# Altium footprint library PcbLibUltimate (1).pcblib: 202 footprints (part 5 of 13)
Each footprint in its own frame and in the unit in brackets; x right, y up, seen from the top. Pads: shape width x height; smd on the part's side, far side on the other; paste and mask are expansions set on the pad; w line width, h text height; cw(c..) or ccw(c..) is an arc to the next point about the centre after c.
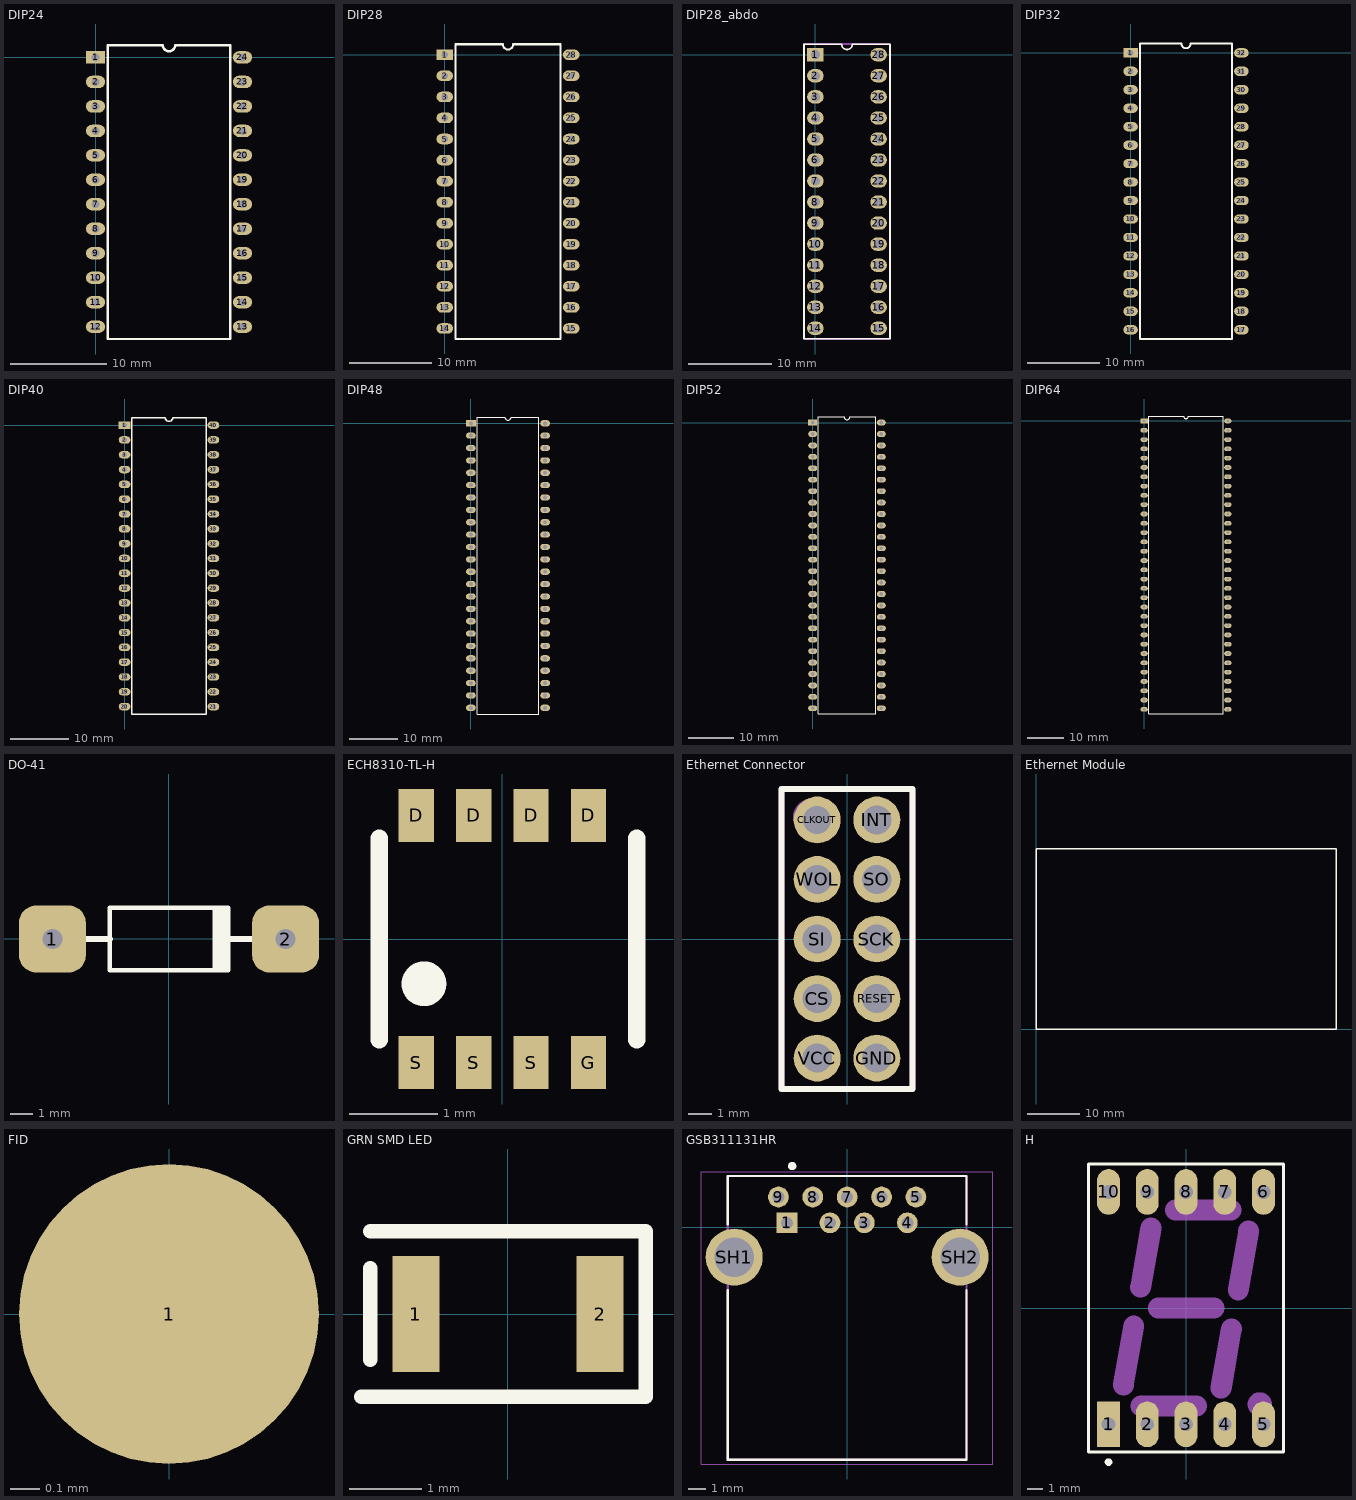
[diagram p4: the footprints below, top view; thin cyan lines are the x and y axes]

## DIP24 [mil]
pads (24):
  rect 78.74x50 hole 32: 1(0,0)
  oval 78.74x50 hole 32: 2(0,-100) 3(0,-200) 4(0,-300) 5(0,-400) 6(0,-500) 7(0,-600) 8(0,-700) 9(0,-800) 10(0,-900) 11(0,-1000) 12(0,-1100) 13(600,-1100) 14(600,-1000) 15(600,-900) 16(600,-800) 17(600,-700) 18(600,-600) 19(600,-500) 20(600,-400) 21(600,-300) 22(600,-200) 23(600,-100) 24(600,0)
Top Overlay:
  lines w10: 50,-1150 50,50 275,50 ccw(c300,50) 325,50 550,50 550,-1150 50,-1150

## DIP28 [mil]
pads (28):
  rect 78.74x50 hole 32: 1(0,0)
  oval 78.74x50 hole 32: 2(0,-100) 3(0,-200) 4(0,-300) 5(0,-400) 6(0,-500) 7(0,-600) 8(0,-700) 9(0,-800) 10(0,-900) 11(0,-1000) 12(0,-1100) 13(0,-1200) 14(0,-1300) 15(600,-1300) 16(600,-1200) 17(600,-1100) 18(600,-1000) 19(600,-900) 20(600,-800) 21(600,-700) 22(600,-600) 23(600,-500) 24(600,-400) 25(600,-300) 26(600,-200) 27(600,-100) 28(600,0)
Top Overlay:
  lines w10: 50,-1350 550,-1350 550,50 325,50 cw(c300,50) 275,50 50,50 50,-1350

## DIP28_abdo [mm]
pads (28):
  rect 2x1.6 hole 1.1: 1(0,0)
  oval 2x1.6 hole 1.1: 2(0,-2.54) 3(0,-5.08) 4(0,-7.62) 5(0,-10.16) 6(0,-12.7) 7(0,-15.24) 8(0,-17.78) 9(0,-20.32) 10(0,-22.86) 11(0,-25.4) 12(0,-27.94) 13(0,-30.48) 14(0,-33.02) 15(7.62,-33.02) 16(7.62,-30.48) 17(7.62,-27.94) 18(7.62,-25.4) 19(7.62,-22.86) 20(7.62,-20.32) 21(7.62,-17.78) 22(7.62,-15.24) 23(7.62,-12.7) 24(7.62,-10.16) 25(7.62,-7.62) 26(7.62,-5.08) 27(7.62,-2.54) 28(7.62,0)
Top Overlay:
  lines w0.2: -1.39,-34.29 9.01,-34.29 9.01,1.27 4.445,1.27 cw(c3.81,1.27) 3.175,1.27 -1.39,1.27 -1.39,-34.29
Mechanical 29:
  circle w0.5: c0.01,-0.01 r0.361
  lines w0.254: -1.39,-34.21 -1.29,-34.31 9.01,-34.31 9.01,1.19 8.91,1.29 -1.39,1.29 -1.39,-34.21
  text "'.Designator'" at 4.01,-17.31 h1.52
3D body "User Library-28 pin dip-1.step": height 7.55, standoff 1.33, extent -0.254,-34.481 7.62,1.461

## DIP32 [mil]
pads (32):
  rect 78.74x50 hole 32: 1(0,0)
  oval 78.74x50 hole 32: 2(0,-100) 3(0,-200) 4(0,-300) 5(0,-400) 6(0,-500) 7(0,-600) 8(0,-700) 9(0,-800) 10(0,-900) 11(0,-1000) 12(0,-1100) 13(0,-1200) 14(0,-1300) 15(0,-1400) 16(0,-1500) 17(600,-1500) 18(600,-1400) 19(600,-1300) 20(600,-1200) 21(600,-1100) 22(600,-1000) 23(600,-900) 24(600,-800) 25(600,-700) 26(600,-600) 27(600,-500) 28(600,-400) 29(600,-300) 30(600,-200) 31(600,-100) 32(600,0)
Top Overlay:
  lines w10: 50,-1550 50,50 275,50 ccw(c300,50) 325,50 550,50 550,-1550 50,-1550

## DIP40 [mil]
pads (40):
  rect 78.74x50 hole 32: 1(0,0)
  oval 78.74x50 hole 32: 2(0,-100) 3(0,-200) 4(0,-300) 5(0,-400) 6(0,-500) 7(0,-600) 8(0,-700) 9(0,-800) 10(0,-900) 11(0,-1000) 12(0,-1100) 13(0,-1200) 14(0,-1300) 15(0,-1400) 16(0,-1500) 17(0,-1600) 18(0,-1700) 19(0,-1800) 20(0,-1900) 21(600,-1900) 22(600,-1800) 23(600,-1700) 24(600,-1600) 25(600,-1500) 26(600,-1400) 27(600,-1300) 28(600,-1200) 29(600,-1100) 30(600,-1000) 31(600,-900) 32(600,-800) 33(600,-700) 34(600,-600) 35(600,-500) 36(600,-400) 37(600,-300) 38(600,-200) 39(600,-100) 40(600,0)
Top Overlay:
  lines w10: 50,-1950 550,-1950 550,50 325,50 cw(c300,50) 275,50 50,50 50,-1950

## DIP48 [mil]
pads (48):
  rect 78.74x50 hole 32: 1(0,0)
  oval 78.74x50 hole 32: 2(0,-100) 3(0,-200) 4(0,-300) 5(0,-400) 6(0,-500) 7(0,-600) 8(0,-700) 9(0,-800) 10(0,-900) 11(0,-1000) 12(0,-1100) 13(0,-1200) 14(0,-1300) 15(0,-1400) 16(0,-1500) 17(0,-1600) 18(0,-1700) 19(0,-1800) 20(0,-1900) 21(0,-2000) 22(0,-2100) 23(0,-2200) 24(0,-2300) 25(600,-2300) 26(600,-2200) 27(600,-2100) 28(600,-2000) 29(600,-1900) 30(600,-1800) 31(600,-1700) 32(600,-1600) 33(600,-1500) 34(600,-1400) 35(600,-1300) 36(600,-1200) 37(600,-1100) 38(600,-1000) 39(600,-900) 40(600,-800) 41(600,-700) 42(600,-600) 43(600,-500) 44(600,-400) 45(600,-300) 46(600,-200) 47(600,-100) 48(600,0)
Top Overlay:
  lines w10: 50,-2350 550,-2350 550,50 325,50 cw(c300,50) 275,50 50,50 50,-2350

## DIP52 [mil]
pads (52):
  rect 78.74x50 hole 32: 1(0,0)
  oval 78.74x50 hole 32: 2(0,-100) 3(0,-200) 4(0,-300) 5(0,-400) 6(0,-500) 7(0,-600) 8(0,-700) 9(0,-800) 10(0,-900) 11(0,-1000) 12(0,-1100) 13(0,-1200) 14(0,-1300) 15(0,-1400) 16(0,-1500) 17(0,-1600) 18(0,-1700) 19(0,-1800) 20(0,-1900) 21(0,-2000) 22(0,-2100) 23(0,-2200) 24(0,-2300) 25(0,-2400) 26(0,-2500) 27(600,-2500) 28(600,-2400) 29(600,-2300) 30(600,-2200) 31(600,-2100) 32(600,-2000) 33(600,-1900) 34(600,-1800) 35(600,-1700) 36(600,-1600) 37(600,-1500) 38(600,-1400) 39(600,-1300) 40(600,-1200) 41(600,-1100) 42(600,-1000) 43(600,-900) 44(600,-800) 45(600,-700) 46(600,-600) 47(600,-500) 48(600,-400) 49(600,-300) 50(600,-200) 51(600,-100) 52(600,0)
Top Overlay:
  lines w10: 50,-2550 550,-2550 550,50 325,50 cw(c300,50) 275,50 50,50 50,-2550

## DIP64 [mil]
pads (64):
  rect 78.74x50 hole 32: 1(0,0)
  oval 78.74x50 hole 32: 2(0,-100) 3(0,-200) 4(0,-300) 5(0,-400) 6(0,-500) 7(0,-600) 8(0,-700) 9(0,-800) 10(0,-900) 11(0,-1000) 12(0,-1100) 13(0,-1200) 14(0,-1300) 15(0,-1400) 16(0,-1500) 17(0,-1600) 18(0,-1700) 19(0,-1800) 20(0,-1900) 21(0,-2000) 22(0,-2100) 23(0,-2200) 24(0,-2300) 25(0,-2400) 26(0,-2500) 27(0,-2600) 28(0,-2700) 29(0,-2800) 30(0,-2900) 31(0,-3000) 32(0,-3100) 33(900,-3100) 34(900,-3000) 35(900,-2900) 36(900,-2800) 37(900,-2700) 38(900,-2600) 39(900,-2500) 40(900,-2400) 41(900,-2300) 42(900,-2200) 43(900,-2100) 44(900,-2000) 45(900,-1900) 46(900,-1800) 47(900,-1700) 48(900,-1600) 49(900,-1500) 50(900,-1400) 51(900,-1300) 52(900,-1200) 53(900,-1100) 54(900,-1000) 55(900,-900) 56(900,-800) 57(900,-700) 58(900,-600) 59(900,-500) 60(900,-400) 61(900,-300) 62(900,-200) 63(900,-100) 64(900,0)
Top Overlay:
  lines w10: 50,-3150 50,50 425,50 ccw(c450,50) 475,50 850,50 850,-3150 50,-3150

## DO-41 [mm] "Diode, Axial; Body 5.2 x 2.7 mm (LxDia. max), Lead Dia. 0.86 mm (max)"
height 2.8
pads (2):
  rrect50% 3x3 hole 0.9: 1(-5.23,0) 2(5.23,0)
Top Overlay:
  rectangle: 1.95,-1.4 2.75,1.4
  lines w0.2: 2.65,-1.4 -2.65,-1.4 -2.65,1.4 2.65,1.4
  lines w0.254: -5.23,0 -2.65,0 ; 2.5,0 5.23,0

## ECH8310-TL-H [mm]
pads (8):
  rect 0.4x0.6 smd: D(-0.975,1.4) D(-0.325,1.4) D(0.325,1.4) D(0.975,1.4) G(0.975,-1.4) S(-0.975,-1.4) S(-0.325,-1.4) S(0.325,-1.4)
Top Overlay:
  circle w0.254: c-0.889,-0.508 r0.127
  lines w0.2: -1.397,-1.143 -1.397,1.143 ; 1.524,-1.143 1.524,1.143
3D body "ECH8310-TL-H.stp": height 0.95, standoff 0, extent -1.45,-1.4 1.45,1.4

## Ethernet Connector [mm]
pads (10):
  round 2 hole 1.2: CLKOUT(-1.275,5.08)
  round 2 hole 1.25: CS(-1.275,-2.54) GND(1.275,-5.08) INT(1.275,5.08) RESET(1.275,-2.54) SCK(1.275,0) SI(-1.275,0) SO(1.275,2.54) VCC(-1.275,-5.08) WOL(-1.275,2.54)
Top Overlay:
  lines w0.254: -2.8,-6.4 2.8,-6.4 2.8,6.4 -2.8,6.4 -2.8,-6.4
Mechanical 2:
  circle w1.2: c-1.5,5.2 r0.2
  lines w0.254: -2.8,-6.4 2.8,-6.4 2.8,6.35 2.75,6.4 -2.8,6.4 -2.8,-6.4
  text ".Designator" at -0.65,2.2 h2
3D body "_ _ _C021LFBN-RC.STEP": height 8.51, standoff -3.19, extent -2.785,3.81 2.795,6.35
3D body "_ _ _C021LFBN-RC.STEP": height 8.51, standoff -3.19, extent -2.785,1.27 2.795,3.81
3D body "_ _ _C021LFBN-RC.STEP": height 8.51, standoff -3.19, extent -2.785,-3.81 2.795,-1.27
3D body "_ _ _C021LFBN-RC.STEP": height 8.51, standoff -3.19, extent -2.785,-1.27 2.795,1.27
3D body "_ _ _C021LFBN-RC.STEP": height 8.51, standoff -3.19, extent -2.785,-6.35 2.795,-3.81

## Ethernet Module [mil]
Top Overlay:
  lines w10: 0,0 2263.78,0 2263.78,1358.27 0,1358.27 0,0
3D body "User Library-ENC28J60-Module.STEP": height 564.96, standoff -84.65, extent 0,0 2255.18,1358.27

## FID [mil]
pads (1):
  round 40 smd paste-1574.8 mask+40: 1(0,0)

## GRN SMD LED [mm]
pads (2):
  rect 0.65x1.6 smd: 1(-1.275,0) 2(1.275,0)
Top Overlay:
  lines w0.2: -2.032,-1.143 1.905,-1.143 1.905,1.143 -1.905,1.143 ; -1.905,-0.635 -1.905,0.635
3D body "User Library-LED 1206 BLUE.step": height 1.1, standoff 0, extent -1.6,-0.8 1.6,0.8

## GSB311131HR [mm]
pads (11):
  rect 1.208x1.208 hole 0.7: 1(-3.5,0.25)
  round 1.208 hole 0.7: 2(-1,0.25) 3(1,0.25) 4(3.5,0.25) 5(4,1.75) 6(2,1.75) 7(0,1.75) 8(-2,1.75) 9(-4,1.75)
  round 3.316 hole 2.3: SH1(-6.57,-1.75) SH2(6.57,-1.75)
Top Overlay:
  circle w0.24: c-3.2,3.55 r0.12
  lines w0.127: -6.95,-3.65 -6.95,-13.53 6.95,-13.53 6.95,-3.65 ; -6.95,0.15 -6.95,2.97 6.95,2.97 6.95,0.15
Mechanical 13:
  lines w0.127: -6.95,-13.53 6.95,-13.53 6.95,2.97 -6.95,2.97 -6.95,-13.53
Mechanical 15:
  lines w0.05: -8.5,-13.78 8.48,-13.78 8.48,3.22 -8.5,3.22 -8.5,-13.78
3D body "484050003.stp": height 8.47, standoff -3.14, extent -7.747,-13.457 7.853,3.043

## H [mm] "LED, 7-Segment Display, 14.2 mm, RHD; 10 Leads; Row Space 15.24 mm; Pitch 2.54 mm"
height 8.25
pads (10):
  rect 1.5x3 hole 0.9: 1(-5.08,-7.62)
  oval 1.5x3 hole 0.9: 2(-2.54,-7.62) 3(0,-7.62) 4(2.54,-7.62) 5(5.08,-7.62) 6(5.08,7.62) 7(2.54,7.62) 8(0,7.62) 9(-2.54,7.62) 10(-5.08,7.62)
Top Overlay:
  circle w0.25: c-5.08,-10.1 r0.125
  lines w0.2: -6.4,-9.45 6.4,-9.45 6.4,9.45 -6.4,9.45 -6.4,-9.45
Mechanical 1:
  circle w1: c4.842,-6.316 r0.296
  lines w1.37: -4.108,-5.054 -3.425,-1.17 ; -2.974,1.368 -2.293,5.255 ; -2.958,-6.429 0.692,-6.426 ; -1.821,0 1.828,0 ; -0.689,6.425 2.96,6.425 ; 2.295,-5.256 2.981,-1.371 ; 3.427,1.169 4.111,5.058
Mechanical 13:
  lines w0.1: -6.4,-9.45 -6.4,9.45 6.4,9.45 6.4,-9.45 -6.4,-9.45
3D body: height 8.25, standoff 0, extent -6.4,-9.45 6.4,9.45